# Altium footprint library PcbLib1.PcbLib: 148 footprints (part 7 of 10)
Each footprint in its own frame and in the unit in brackets; x right, y up, seen from the top. Pads: shape width x height; smd on the part's side, far side on the other; paste and mask are expansions set on the pad; w line width, h text height; cw(c..) or ccw(c..) is an arc to the next point about the centre after c.
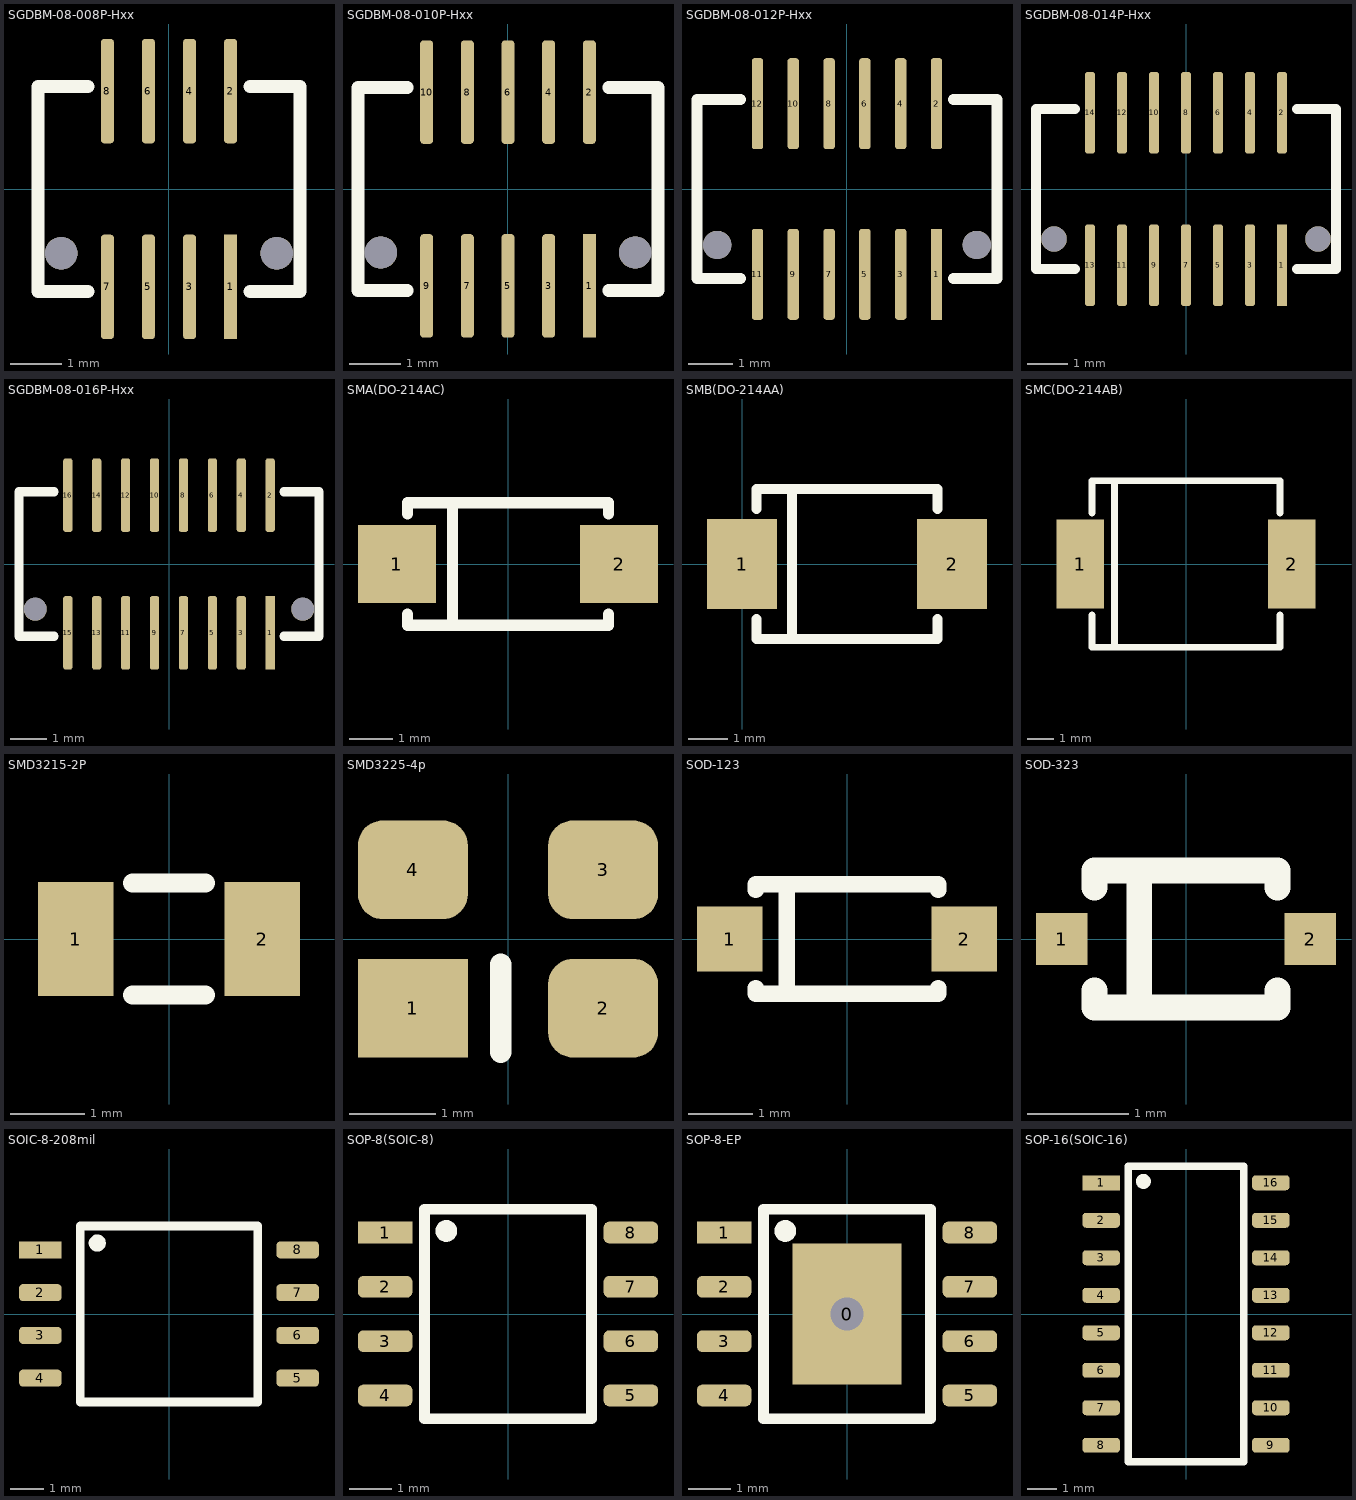
[diagram p6: the footprints below, top view; thin cyan lines are the x and y axes]

## SGDBM-08-008P-Hxx [mil] "山谷道电子 0.8mm 8pin Male"
pads (10):
  rect 10x80 smd: 1(47.24,-75)
  rrect50% 10x80 smd: 2(47.24,75) 3(15.75,-75) 4(15.75,75) 5(-15.75,-75) 6(-15.75,75) 7(-47.24,-75) 8(-47.24,75)
  round 25 hole 25 unplated: ""(-82.68,-49.21) ""(82.68,-49.21)
Top Overlay:
  lines w10: -62.24,-78.74 -100.39,-78.74 -100.39,78.74 -62.24,78.74 ; 62.24,-78.74 100.39,-78.74 100.39,78.74 62.24,78.74

## SGDBM-08-010P-Hxx [mil] "山谷道电子 0.8mm 10pin Male"
pads (12):
  rect 10x80 smd: 1(62.99,-75)
  rrect50% 10x80 smd: 2(62.99,75) 3(31.5,-75) 4(31.5,75) 5(0,-75) 6(0,75) 7(-31.5,-75) 8(-31.5,75) 9(-62.99,-75) 10(-62.99,75)
  round 25 hole 25 unplated: ""(-98.43,-49.21) ""(98.43,-49.21)
Top Overlay:
  lines w10: -77.99,-78.74 -116.14,-78.74 -116.14,78.74 -77.99,78.74 ; 77.99,-78.74 116.14,-78.74 116.14,78.74 77.99,78.74

## SGDBM-08-012P-Hxx [mil] "山谷道电子 0.8mm 12pin Male"
pads (14):
  rect 10x80 smd: 1(78.74,-75)
  rrect50% 10x80 smd: 2(78.74,75) 3(47.24,-75) 4(47.24,75) 5(15.75,-75) 6(15.75,75) 7(-15.75,-75) 8(-15.75,75) 9(-47.24,-75) 10(-47.24,75) 11(-78.74,-75) 12(-78.74,75)
  round 25 hole 25 unplated: ""(-114.17,-49.21) ""(114.17,-49.21)
Top Overlay:
  lines w10: -93.74,-78.74 -131.89,-78.74 -131.89,78.74 -93.74,78.74 ; 93.74,-78.74 131.89,-78.74 131.89,78.74 93.74,78.74

## SGDBM-08-014P-Hxx [mil] "山谷道电子 0.8mm 14pin Male"
pads (16):
  rect 10x80 smd: 1(94.49,-75)
  rrect50% 10x80 smd: 2(94.49,75) 3(62.99,-75) 4(62.99,75) 5(31.5,-75) 6(31.5,75) 7(0,-75) 8(0,75) 9(-31.5,-75) 10(-31.5,75) 11(-62.99,-75) 12(-62.99,75) 13(-94.49,-75) 14(-94.49,75)
  round 25 hole 25 unplated: ""(-129.92,-49.21) ""(129.92,-49.21)
Top Overlay:
  lines w10: -109.49,-78.74 -147.64,-78.74 -147.64,78.74 -109.49,78.74 ; 109.49,-78.74 147.64,-78.74 147.64,78.74 109.49,78.74

## SGDBM-08-016P-Hxx [mil] "山谷道电子 0.8mm 16pin Male"
pads (18):
  rect 10x80 smd: 1(110.24,-75)
  rrect50% 10x80 smd: 2(110.24,75) 3(78.74,-75) 4(78.74,75) 5(47.24,-75) 6(47.24,75) 7(15.75,-75) 8(15.75,75) 9(-15.75,-75) 10(-15.75,75) 11(-47.24,-75) 12(-47.24,75) 13(-78.74,-75) 14(-78.74,75) 15(-110.24,-75) 16(-110.24,75)
  round 25 hole 25 unplated: ""(-145.67,-49.21) ""(145.67,-49.21)
Top Overlay:
  lines w10: -125.24,-78.74 -163.39,-78.74 -163.39,78.74 -125.24,78.74 ; 125.24,-78.74 163.39,-78.74 163.39,78.74 125.24,78.74

## SMA(DO-214AC) [mil]
pads (2):
  rect 70x70 smd: 1(-100,0) 2(100,0)
Top Overlay:
  lines w10: -90.55,-45 -90.55,-55.12 90.55,-55.12 90.55,-45 ; -90.55,45 -90.55,55.12 90.55,55.12 90.55,45 ; -50,-55.12 -50,55.12
3D body "SMA(DO-214AC).step": height 104.09, standoff 0.07, extent -105.51,-57.01 105.51,57.01

## SMB(DO-214AA) [mil]
pads (2):
  rect 70x90 smd: 1(0,0) 2(210,0)
Top Overlay:
  lines w10: 14.45,-55 14.45,-74.8 195.55,-74.8 195.55,-55 ; 14.45,55 14.45,74.8 195.55,74.8 195.55,55 ; 50,-74.8 50,74.8
3D body "SMB(DO-214AA).step": height 104.09, standoff 0.07, extent -5,-77.99 215,77.99

## SMC(DO-214AB) [mil]
pads (2):
  rect 70x130 smd: 1(-155,0) 2(155,0)
Top Overlay:
  lines w10: -137.8,-75 -137.8,-122.05 137.8,-122.05 137.8,-75 ; -137.8,75 -137.8,122.05 137.8,122.05 137.8,75 ; -105,-122.05 -105,122.05
3D body "SMC(DO-214AB).step": height 104.09, standoff 0.03, extent -160.51,-122.99 160.51,122.99

## SMD3215-2P [mil]
pads (2):
  rect 40x60 smd: 1(-49.21,0) 2(49.21,0)
Top Overlay:
  lines w10: -19.21,-29.53 19.21,-29.53 ; -19.21,29.53 19.21,29.53
3D body "SMD3215-2P.stp": height 30.46, standoff 0.15, extent -62.99,-29.55 62.99,29.5

## SMD3225-4p [mm]
pads (4):
  rect 1.27x1.143 smd: 1(-1.1,-0.8)
  rrect50% 1.27x1.143 smd: 2(1.1,-0.8) 3(1.1,0.8) 4(-1.1,0.8)
Top Overlay:
  lines w0.254: -0.084,-1.308 -0.084,-0.292
3D body "SMD3225-4p.stp": height 1.04, standoff 0, extent -1.62,-1.27 1.62,1.27

## SOD-123 [mil]
pads (2):
  rect 40x40 smd: 1(-71.77,0) 2(71.77,0)
Top Overlay:
  lines w10: -55.91,-30 -55.91,-33.46 55.91,-33.46 55.91,-30 ; -55.91,30 -55.91,33.46 55.91,33.46 55.91,30 ; -36.77,-33.46 -36.77,33.46
3D body "SOD-123.step": height 53.15, standoff 0, extent -73.03,-31.5 73.03,31.5

## SOD-323 [mil]
pads (2):
  rect 20x20 smd: 1(-48.15,0) 2(48.15,0)
Top Overlay:
  lines w10: -35.43,-20 -35.43,-26.57 35.43,-26.57 35.43,-20 ; -35.43,20 -35.43,26.57 35.43,26.57 35.43,20 ; -18.15,-26.57 -18.15,26.57
3D body "SOD-323.step": height 43.31, standoff 0, extent -49.21,-24.61 49.21,24.61

## SOIC-8-208mil [mil]
pads (8):
  rect 50x20 smd: 1(-150.51,75)
  rrect50% 50x20 smd: 2(-150.51,25) 3(-150.51,-25) 4(-150.51,-75) 5(150.51,-75) 6(150.51,-25) 7(150.51,25) 8(150.51,75)
Top Overlay:
  circle w10: c-83.94,82.95 r5
  lines w10: -103.94,-102.95 103.94,-102.95 103.94,102.95 -103.94,102.95 -103.94,-102.95
3D body "SOIC-8-208mil.step": height 82.68, standoff 0, extent -156.99,-103.15 156.99,103.15

## SOP-8(SOIC-8) [mil]
pads (8):
  rect 50x20 smd: 1(-113.11,75)
  rrect50% 50x20 smd: 2(-113.11,25) 3(-113.11,-25) 4(-113.11,-75) 5(113.11,-75) 6(113.11,-25) 7(113.11,25) 8(113.11,75)
Top Overlay:
  circle w10: c-56.77,76.46 r5
  lines w10: -76.77,-96.46 -76.77,96.46 76.77,96.46 76.77,-96.46 -76.77,-96.46
3D body "SOP-8(SOIC-8).step": height 66.93, standoff 0, extent -118.11,-96.46 118.11,96.46

## SOP-8-EP [mil]
pads (9):
  rect 100x130 smd: 0(0,0)
  rect 50x20 smd: 1(-113.11,75)
  rrect50% 50x20 smd: 2(-113.11,25) 3(-113.11,-25) 4(-113.11,-75) 5(113.11,-75) 6(113.11,-25) 7(113.11,25) 8(113.11,75)
via 0,0 diameter 40 hole 30
Top Overlay:
  circle w10: c-56.77,76.46 r5
  lines w10: -76.77,-96.46 -76.77,96.46 76.77,96.46 76.77,-96.46 -76.77,-96.46
3D body "SOP-8-EP.step": height 65.93, standoff -1, extent -118.11,-96.46 118.11,96.46

## SOP-16(SOIC-16) [mil]
pads (16):
  rect 50x20 smd: 1(-113.11,175)
  rrect50% 50x20 smd: 2(-113.11,125) 3(-113.11,75) 4(-113.11,25) 5(-113.11,-25) 6(-113.11,-75) 7(-113.11,-125) 8(-113.11,-175) 9(113.11,-175) 10(113.11,-125) 11(113.11,-75) 12(113.11,-25) 13(113.11,25) 14(113.11,75) 15(113.11,125) 16(113.11,175)
Top Overlay:
  circle w10: c-56.77,176.85 r5
  lines w10: -76.77,-196.85 -76.77,196.85 76.77,196.85 76.77,-196.85 -76.77,-196.85
3D body "SOP-16(SOIC-16).step": height 68.9, standoff 0, extent -118.11,-194.88 118.11,194.88